# Altium footprint library My Footprint 3D.PCBLIB: 447 footprints (part 7 of 29)
Each footprint in its own frame and in the unit in brackets; x right, y up, seen from the top. Pads: shape width x height; smd on the part's side, far side on the other; paste and mask are expansions set on the pad; w line width, h text height; cw(c..) or ccw(c..) is an arc to the next point about the centre after c.
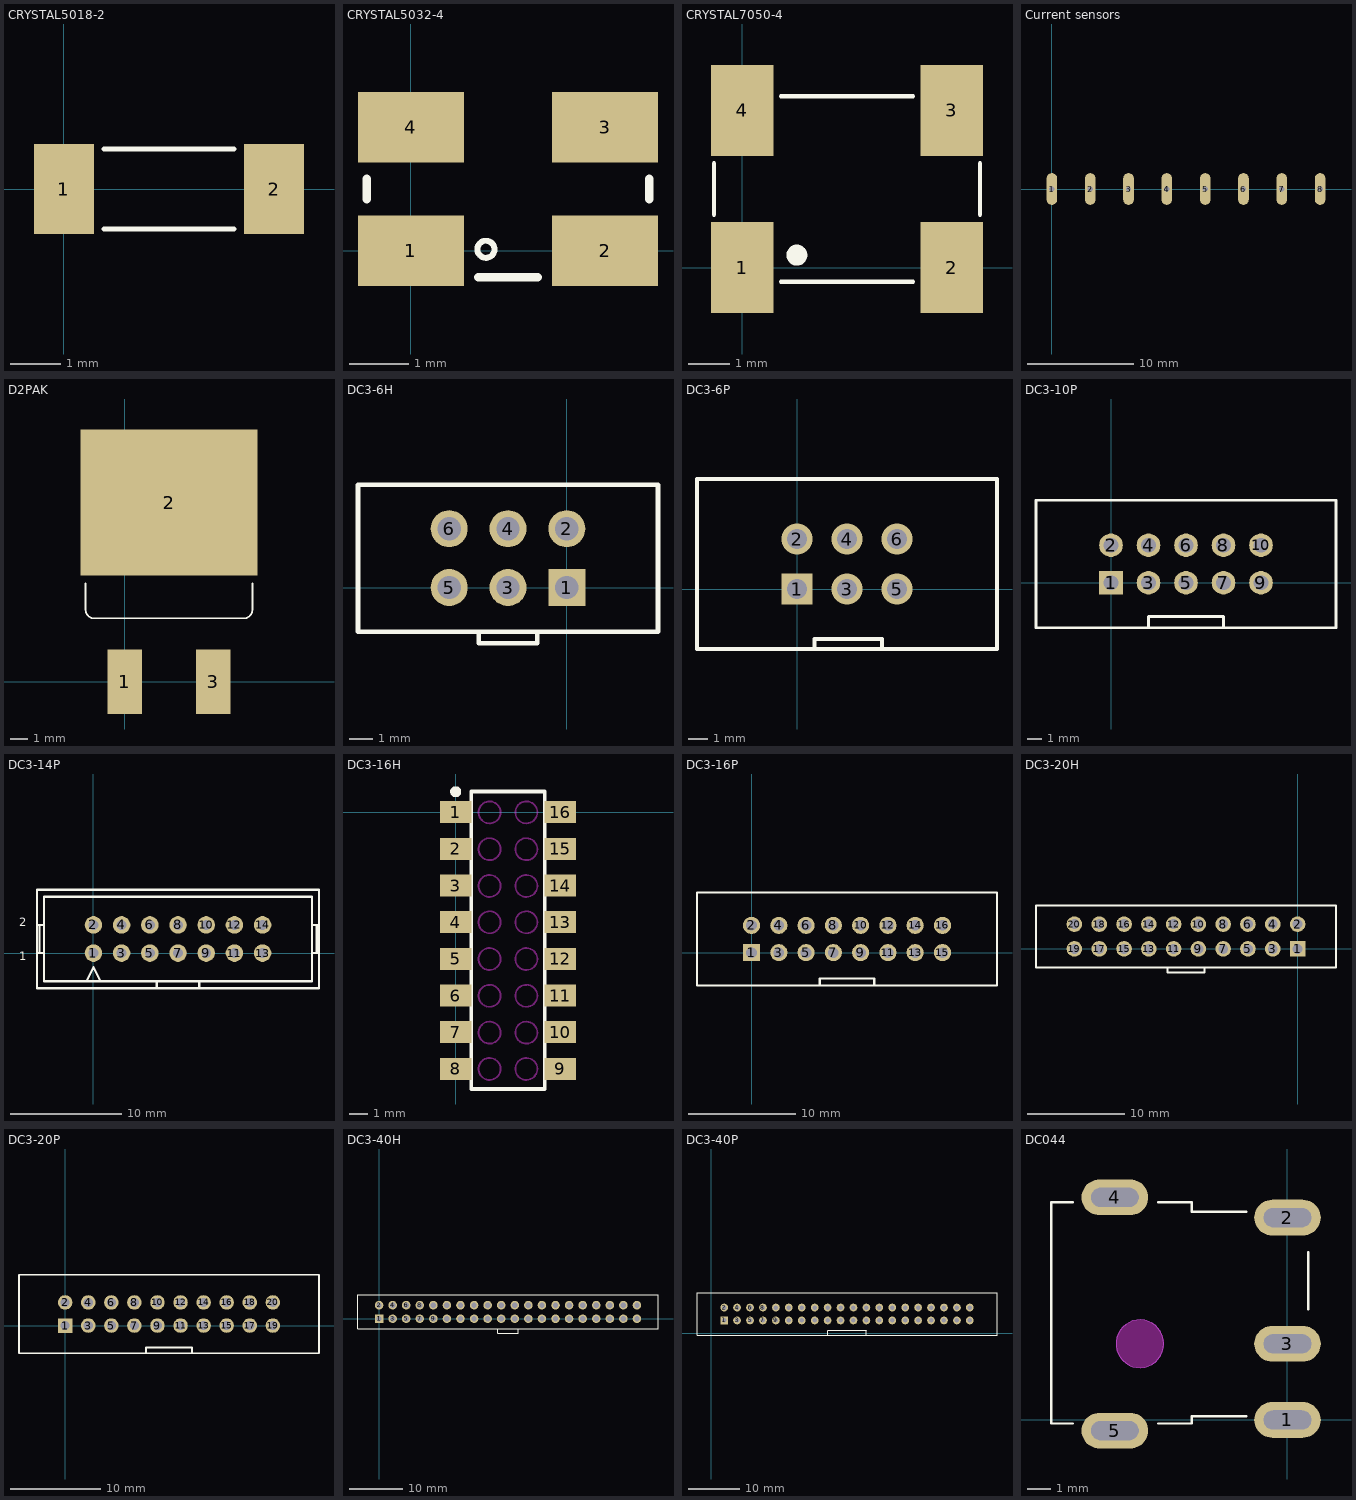
[diagram p6: the footprints below, top view; thin cyan lines are the x and y axes]

## CRYSTAL5018-2 [mm]
pads (2):
  rect 1.2x1.8 smd: 1(0,0) 2(4.2,0)
Top Overlay:
  lines w0.1: 0.8,-0.8 3.4,-0.8 ; 0.8,0.8 3.4,0.8
3D body: height 0.5, standoff 0.3, extent 0,-0.4 4.2,0.4
3D body: height 1, standoff 0.91, extent -0.4,-0.9 4.6,0.9
3D body: height 0.1, standoff 0, extent -0.4,-0.9 4.6,0.9
3D body: height 0.9, standoff 0, extent -0.4,-0.9 4.6,0.9
3D body: height 0.2, standoff 0.1, extent -0.2,-0.5 1.4,0.5
3D body: height 0.2, standoff 0.1, extent 2.804,-0.5 4.404,0.5

## CRYSTAL5032-4 [mm]
pads (4):
  rect 1.8x1.2 smd: 1(0,0) 2(3.3,0) 3(3.3,2.1) 4(0,2.1)
Top Overlay:
  circle w0.1: c1.275,0.025 r0.146
  lines w0.15: -0.75,0.875 -0.75,1.225 ; 1.15,-0.45 2.15,-0.45 ; 4.05,0.875 4.05,1.225
3D body: height 0.9, standoff 0, extent -0.9,-0.6 4.2,2.7
3D body: height 1, standoff 0.9, extent -0.8,-0.5 4.1,2.6
3D body: height 1.1, standoff 1, extent -0.75,-0.45 4.05,2.55
3D body: height 0.5, standoff 0, extent 0,-0.525 0.55,-0.5
3D body: height 0.5, standoff 0, extent 0,2.6 0.55,2.625
3D body: height 0.5, standoff 0, extent 2.75,-0.525 3.3,-0.5
3D body: height 0.5, standoff 0, extent 2.75,2.6 3.3,2.625

## CRYSTAL7050-4 [mm]
pads (4):
  rect 1.524x2.2 smd: 1(0,0) 2(5.08,0) 3(5.08,3.81) 4(0,3.81)
Top Overlay:
  circle w0.254: c1.323,0.3 r0.127
  lines w0.1: -0.685,1.28 -0.685,2.53 ; 0.94,-0.345 4.14,-0.345 ; 0.94,4.155 4.14,4.155 ; 5.765,1.28 5.765,2.53
3D body: height 0.5, standoff 0, extent -0.584,-0.762 0.584,-0.584
3D body: height 1.21, standoff 1.2, extent -1.003,-0.595 6.083,4.409
3D body: height 1.2, standoff 0, extent -1.003,-0.595 6.083,4.409
3D body: height 0.5, standoff 0, extent 4.496,-0.762 5.664,-0.584
3D body: height 0.5, standoff 0, extent 4.496,4.394 5.664,4.572
3D body: height 0.5, standoff 0, extent -0.584,4.394 0.584,4.572
3D body: height 1.3, standoff 1.21, extent -0.87,-0.481 5.873,4.269

## Current sensors [mm]
pads (8):
  oval 1x3 hole 0.5: 1(0,0) 2(3.62,0) 3(7.24,0) 4(10.86,0) 5(14.48,0) 6(18.1,0) 7(21.72,0) 8(25.34,0)

## D2PAK [mm] "Body 15.5mmX 10.5 mm"
height 4.5
pads (3):
  rect 2x3.7 smd: 1(0,0) 3(5.08,0)
  rect 10.2x8.4 smd: 2(2.54,10.3)
Top Overlay:
  lines w0.1: -2.26,5.65 -2.26,4.15 ccw(c-1.76,4.15) -1.76,3.65 6.84,3.65 ; 7.34,5.65 7.34,4.15 cw(c6.84,4.15) 6.84,3.65 ; 6.84,3.65 ccw(c6.84,3.65) 6.84,3.65
3D body: height 3, standoff 2.5, extent 4.42,1 5.72,3.5
3D body: height 3, standoff 0, extent 4.42,1 5.72,1.5
3D body: height 0.5, standoff 0, extent 4.72,-1.5 5.42,1.5
3D body: height 3, standoff 2.5, extent -0.66,1 0.64,3.5
3D body: height 3, standoff 0, extent -0.66,1 0.64,1.5
3D body: height 0.5, standoff 0, extent -0.36,-1.5 0.34,1.5
3D body: height 4.5, standoff 1.3, extent -2.46,3.5 7.54,12.5
3D body: height 1.3, standoff 0, extent -2.46,3.5 7.54,11.5
3D body: height 1.3, standoff 0, extent -1.46,6.5 6.54,11.5
3D body: height 1.3, standoff 0, extent -2.46,11.5 7.54,13.5
3D body: height 3, standoff 2.5, extent 1.89,2 3.19,3.5

## DC3-6H [mm] "Distance 2.54mm,Hold"
pads (6):
  rect 1.6x1.6 hole 1: 1(0,0)
  round 1.6 hole 1: 2(0,2.54) 3(-2.54,0) 4(-2.54,2.54) 5(-5.08,0) 6(-5.08,2.54)
Top Overlay:
  lines w0.2: -3.81,-1.905 -3.81,-2.413 -1.27,-2.413 -1.27,-1.905 ; -9.017,-1.905 3.937,-1.905 3.937,4.445 -9.017,4.445 -9.017,-1.905

## DC3-6P [mm] "Distance 2.54mm,Pin"
height 10
pads (6):
  rect 1.6x1.6 hole 1: 1(0,0)
  round 1.6 hole 1: 2(0,2.54) 3(2.54,0) 4(2.54,2.54) 5(5.08,0) 6(5.08,2.54)
Top Overlay:
  lines w0.2: 0.889,-3.048 0.889,-2.54 4.318,-2.54 4.318,-3.048 ; -5.08,-3.048 10.16,-3.048 10.16,5.588 -5.08,5.588 -5.08,-3.048

## DC3-10P [mm]
pads (10):
  rect 1.6x1.6 hole 1: 1(0,0)
  round 1.6 hole 1: 2(0,2.54) 3(2.54,0) 4(2.54,2.54) 5(5.08,0) 6(5.08,2.54) 7(7.62,0) 8(7.62,2.54) 9(10.16,0) 10(10.16,2.54)
Top Overlay:
  lines w0.2: 2.54,-2.921 2.54,-2.286 2.921,-2.286 7.62,-2.286 7.62,-2.921 ; -5.08,-3.048 -5.08,5.588 15.24,5.588 15.24,-3.048 -5.08,-3.048

## DC3-14P [mil]
height 393.7
pads (14):
  round 62 hole 35: 1(0,0) 2(0,100) 3(100,0) 4(100,100) 5(200,0) 6(200,100) 7(300,0) 8(300,100) 9(400,0) 10(400,100) 11(500,0) 12(500,100) 13(600,0) 14(600,100)
Top Overlay:
  lines w8: -200,0 -175,0 ; -200,100 -175,100 ; -191.67,0 -191.67,100 ; -25,-100 0,-50 25,-100 ; 225,-125 225,-100 ; 375,-125 375,-100 ; 775,0 800,0 ; 775,100 800,100 ; 791.67,0 791.67,100 ; 225,-100 375,-100 ; 225,-100 -175,-100 -175,200 775,200 775,-100 375,-100 ; -200,-125 -200,225 800,225 800,-125 -200,-125
  text "2" at -263.98,95 h30
  text "1" at -263.98,-25 h30
3D body: height 307.09, standoff -78.74, extent 590.16,90.16 609.84,109.84
3D body: height 307.09, standoff -78.74, extent 590.16,-9.84 609.84,9.84
3D body: height 307.09, standoff -78.74, extent 490.16,-9.84 509.84,9.84
3D body: height 307.09, standoff -78.74, extent 490.16,90.16 509.84,109.84
3D body: height 307.09, standoff -78.74, extent 390.16,90.16 409.84,109.84
3D body: height 307.09, standoff -78.74, extent 390.16,-9.84 409.84,9.84
3D body: height 307.09, standoff -78.74, extent 290.16,-9.84 309.84,9.84
3D body: height 307.09, standoff -78.74, extent 290.16,90.16 309.84,109.84
3D body: height 307.09, standoff -78.74, extent 190.16,90.16 209.84,109.84
3D body: height 307.09, standoff -78.74, extent 190.16,-9.84 209.84,9.84
3D body: height 307.09, standoff -78.74, extent 90.16,-9.84 109.84,9.84
3D body: height 307.09, standoff -78.74, extent 90.16,90.16 109.84,109.84
3D body: height 307.09, standoff -78.74, extent -9.84,90.16 9.84,109.84
3D body: height 342.52, standoff 0, extent 389.57,-117.32 796.06,-14.96
3D body: height 342.52, standoff 0, extent -196.06,-117.32 210.43,-14.96
3D body: height 307.09, standoff -78.74, extent -9.84,-9.84 9.84,9.84
3D body: height 98.43, standoff 0, extent -156.69,-117.32 756.69,217.32
3D body: height 342.52, standoff 255.91, extent -196.06,-14.96 -156.69,114.96
3D body: height 342.52, standoff 7.87, extent -196.06,114.96 796.06,217.32
3D body: height 342.52, standoff 255.91, extent 756.69,-14.96 796.06,114.96

## DC3-16H [mm] "Distance 2.0mm,Hold"
height 5
pads (16):
  rect 1.72x1.2 smd: 1(0,0) 2(0,-2) 3(0,-4) 4(0,-6) 5(0,-8) 6(0,-10) 7(0,-12) 8(0,-14) 9(5.72,-14) 10(5.72,-12) 11(5.72,-10) 12(5.72,-8) 13(5.72,-6) 14(5.72,-4) 15(5.72,-2) 16(5.72,0)
Top Overlay:
  circle w0.3: c0.004,1.118 r0.148
  lines w0.2: 0.856,-15.1 0.856,1.125 4.856,1.125 4.856,-15.1 0.856,-15.1
Keep-Out Layer:
  circle w0.1: c3.861,-0.01 r0.6
  circle w0.1: c1.854,-0.01 r0.6
  circle w0.1: c1.854,-2.016 r0.6
  circle w0.1: c3.861,-2.016 r0.6
  circle w0.1: c1.854,-4.023 r0.6
  circle w0.1: c3.861,-4.023 r0.6
  circle w0.1: c1.854,-6.004 r0.6
  circle w0.1: c3.861,-6.004 r0.6
  circle w0.1: c1.854,-8.011 r0.6
  circle w0.1: c3.861,-8.011 r0.6
  circle w0.1: c1.854,-10.017 r0.6
  circle w0.1: c3.861,-10.017 r0.6
  circle w0.1: c1.854,-12.024 r0.6
  circle w0.1: c3.861,-12.024 r0.6
  circle w0.1: c1.854,-14.005 r0.6
  circle w0.1: c3.861,-14.005 r0.6

## DC3-16P [mm]
pads (16):
  rect 1.6x1.6 hole 1: 1(0,0)
  round 1.6 hole 1: 2(0,2.54) 3(2.54,0) 4(2.54,2.54) 5(5.08,0) 6(5.08,2.54) 7(7.62,0) 8(7.62,2.54) 9(10.16,0) 10(10.16,2.54) 11(12.7,0) 12(12.7,2.54) 13(15.24,0) 14(15.24,2.54) 15(17.78,0) 16(17.78,2.54)
Top Overlay:
  lines w0.2: 6.35,-3.048 6.35,-2.413 6.731,-2.413 11.43,-2.413 11.43,-3.048 ; -5.08,-3.048 22.86,-3.048 22.86,5.588 -5.08,5.588 -5.08,-3.048

## DC3-20H [mm] "Distance 2.54mm,Hold"
height 10
pads (20):
  rect 1.6x1.6 hole 1: 1(0,0)
  round 1.6 hole 1: 2(0,2.54) 3(-2.54,0) 4(-2.54,2.54) 5(-5.08,0) 6(-5.08,2.54) 7(-7.62,0) 8(-7.62,2.54) 9(-10.16,0) 10(-10.16,2.54) 11(-12.7,0) 12(-12.7,2.54) 13(-15.24,0) 14(-15.24,2.54) 15(-17.78,0) 16(-17.78,2.54) 17(-20.32,0) 18(-20.32,2.54) 19(-22.86,0) 20(-22.86,2.54)
Top Overlay:
  lines w0.2: -13.335,-1.905 -13.335,-2.413 -12.954,-2.413 -9.525,-2.413 -9.525,-1.905 ; -26.797,-1.905 -26.797,4.445 3.937,4.445 3.937,-1.905 -26.797,-1.905

## DC3-20P [mm] "Distance 2.54mm,Pin"
height 10
pads (20):
  rect 1.6x1.6 hole 1: 1(0,0)
  round 1.6 hole 1: 2(0,2.54) 3(2.54,0) 4(2.54,2.54) 5(5.08,0) 6(5.08,2.54) 7(7.62,0) 8(7.62,2.54) 9(10.16,0) 10(10.16,2.54) 11(12.7,0) 12(12.7,2.54) 13(15.24,0) 14(15.24,2.54) 15(17.78,0) 16(17.78,2.54) 17(20.32,0) 18(20.32,2.54) 19(22.86,0) 20(22.86,2.54)
Top Overlay:
  lines w0.2: 8.89,-3.048 8.89,-2.413 9.271,-2.413 13.97,-2.413 13.97,-3.048 ; -5.08,-3.048 -5.08,5.588 27.94,5.588 27.94,-3.048 -5.08,-3.048

## DC3-40H [mm] "Distance 2.54mm,Hold"
height 10
pads (40):
  rect 1.6x1.6 hole 1: 1(0,0)
  round 1.6 hole 1: 2(0,2.54) 3(2.54,0) 4(2.54,2.54) 5(5.08,0) 6(5.08,2.54) 7(7.62,0) 8(7.62,2.54) 9(10.16,0) 10(10.16,2.54) 11(12.7,0) 12(12.7,2.54) 13(15.24,0) 14(15.24,2.54) 15(17.78,0) 16(17.78,2.54) 17(20.32,0) 18(20.32,2.54) 19(22.86,0) 20(22.86,2.54) 21(25.4,0) 22(25.4,2.54) 23(27.94,0) 24(27.94,2.54) 25(30.48,0) 26(30.48,2.54) 27(33.02,0) 28(33.02,2.54) 29(35.56,0) 30(35.56,2.54) 31(38.1,0) 32(38.1,2.54) 33(40.64,0) 34(40.64,2.54) 35(43.18,0) 36(43.18,2.54) 37(45.72,0) 38(45.72,2.54) 39(48.26,0) 40(48.26,2.54)
Top Overlay:
  lines w0.2: 22.225,-1.905 22.225,-2.667 26.035,-2.667 26.035,-1.905 ; -3.937,-1.905 -3.937,4.445 52.197,4.445 52.197,-1.905 -3.937,-1.905

## DC3-40P [mil] "Distance 2.54mm,Pin"
height 393.7
pads (40):
  rect 60x60 hole 35: 1(100,100)
  round 60 hole 35: 2(100,200) 3(200,100) 4(200,200) 5(300,100) 6(300,200) 7(400,100) 8(400,200) 9(500,100) 10(500,200) 11(600,100) 12(600,200) 13(700,100) 14(700,200) 15(800,100) 16(800,200) 17(900,100) 18(900,200) 19(1000,100) 20(1000,200) 21(1100,100) 22(1100,200) 23(1200,100) 24(1200,200) 25(1300,100) 26(1300,200) 27(1400,100) 28(1400,200) 29(1500,100) 30(1500,200) 31(1600,100) 32(1600,200) 33(1700,100) 34(1700,200) 35(1800,100) 36(1800,200) 37(1900,100) 38(1900,200) 39(2000,100) 40(2000,200)
Top Overlay:
  lines w7.87: 900,-15 900,20 905,25 1195,25 1200,20 1200,-15 ; -110,-15 2210,-15 2210,315 -110,315 -110,-15

## DC044 [mm]
pads (5):
  oval 2.8x1.5 / inner oval 2.8x1.5 / far side oval 2.8x2 hole 0.8 slot 2 at 0 deg: 1(0,0) 2(0,8.5) 3(0,3.2)
  oval 2.8x1.5 hole 0.8 slot 2 at 0 deg: 4(-7.25,9.35) 5(-7.25,-0.45)
Top Overlay:
  lines w0.1: -9.025,-0.15 -9.925,-0.15 -9.925,9.15 -9.025,9.15 ; -5.425,-0.15 -4.025,-0.15 -4.025,0.15 -1.725,0.15 ; -5.425,9.15 -4.025,9.15 -4.025,8.75 -1.725,8.75 ; 0.875,4.65 0.875,7.05
Keep-Out Layer:
  circle w0.05: c-6.2,3.2 r1
  board cut-out: -7.2,3.2 -7.2,3.298 -7.162,3.492 -7.086,3.674 -6.977,3.837 -6.837,3.977 -6.674,4.086 -6.492,4.162 -6.298,4.2 -6.2,4.2 -6.102,4.2 -5.908,4.162 -5.726,4.086 -5.563,3.977 -5.423,3.837 -5.314,3.674 -5.238,3.492 -5.2,3.298 -5.2,3.2 -5.2,3.102 -5.238,2.908 -5.314,2.726 -5.423,2.563 -5.563,2.423 -5.726,2.314 -5.908,2.238 -6.102,2.2 -6.2,2.2 -6.298,2.2 -6.492,2.238 -6.674,2.314 -6.837,2.423 -6.977,2.563 -7.086,2.726 -7.162,2.908 -7.2,3.102
Mechanical 1:
  lines w0.1: -0.9,3.2 0,3.2 ; -0.4,3.2 0.5,3.2
Mechanical 2:
  circle w0.05: c-6.2,3.2 r1
3D body: height 6.6, standoff 0, extent -3.8,-0.2 1.3,9.1
3D body: height 7.2, standoff 0, extent -10.3,-0.5 -3.8,9.5
3D body: height 0, standoff -2, extent -8.15,-0.5 -6.35,-0.3
3D body: height 0, standoff -2, extent -8.15,9.3 -6.35,9.5
3D body: height 0, standoff -2, extent -0.7,-0.1 0.7,0.1
3D body: height 0, standoff -2, extent -0.7,3.1 0.7,3.3
3D body: height 0, standoff -2, extent -0.7,8.4 0.7,8.6
3D body: height 6.4, standoff 0.6, extent -10.4,0.3 -1.4,6.1
3D body: height 4.2, standoff 2.8, extent -10.4,2.505 -1.4,3.9
3D body: height 0, standoff -2, extent -6.9,2.5 -5.5,3.9